# Altium footprint library Mine.PcbLib: 306 footprints (part 10 of 20)
Each footprint in its own frame and in the unit in brackets; x right, y up, seen from the top. Pads: shape width x height; smd on the part's side, far side on the other; paste and mask are expansions set on the pad; w line width, h text height; cw(c..) or ccw(c..) is an arc to the next point about the centre after c.
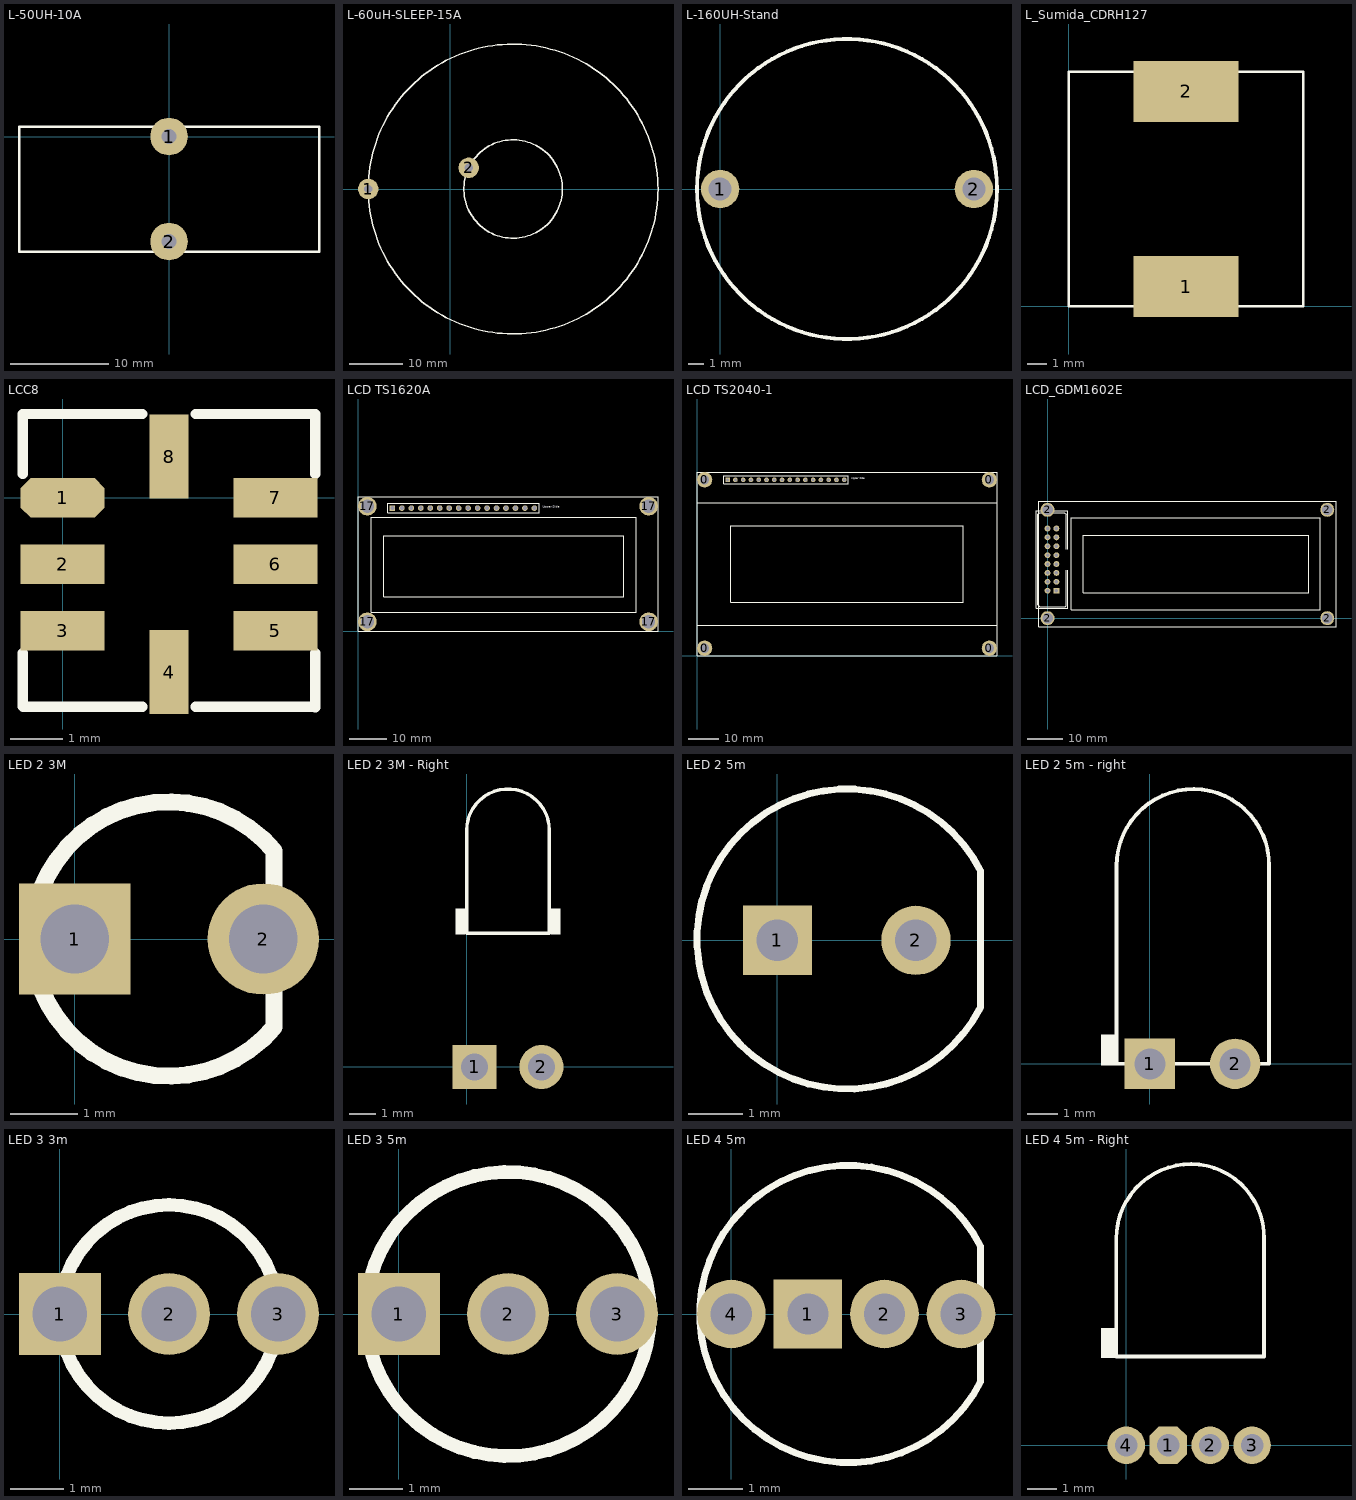
[diagram p9: the footprints below, top view; thin cyan lines are the x and y axes]

## L-50UH-10A [mil]
pads (2):
  round 150 hole 60: 1(0,0) 2(0,-420)
Top Overlay:
  lines w10: -600,-460 -600,40 600,40 600,-460 -600,-460

## L-60uH-SLEEP-15A [mil]
pads (2):
  round 150 hole 60: 1(-600,0) 2(135,155)
Top Overlay:
  circle w10: c460,0 r1060
  circle w10: c460,0 r360

## L-160UH-Stand [mil]
pads (2):
  round 100 hole 60: 1(0,0) 2(660,0)
Top Overlay:
  circle w10: c330,0 r390

## L_Sumida_CDRH127 [mm]
height 8
pads (2):
  rect 5.5x3.2 smd: 1(6.15,1.038) 2(6.15,11.262)
Top Overlay:
  lines w0.127: 0,0 12.3,0 12.3,12.3 0,12.3 0,0

## LCC8 [mm]
height 2
pads (8):
  oct 1.6x0.75 smd: 1(0,0)
  rect 1.6x0.75 smd: 2(0,-1.27) 3(0,-2.54) 5(4.064,-2.54) 6(4.064,-1.27) 7(4.064,0)
  rect 0.75x1.6 smd: 4(2.032,-3.327) 8(2.032,0.787)
Top Overlay:
  lines w0.2: -0.762,-2.972 -0.762,-3.976 -0.75,-3.988 1.524,-3.988 ; -0.762,0.457 -0.762,1.6 1.524,1.6 ; 2.54,-3.988 4.814,-3.988 4.826,-4 4.826,-2.972 ; 2.54,1.6 4.826,1.6 4.826,0.457

## LCD TS1620A [mil] "LCD 2x16"
height 551.18
pads (20):
  rect 60x60 hole 40: 1(363.41,1299.21)
  round 60 hole 40: 2(463.41,1299.21) 3(563.41,1299.21) 4(663.41,1299.21) 5(763.41,1299.21) 6(863.41,1299.21) 7(963.41,1299.21) 8(1063.41,1299.21) 9(1163.41,1299.21) 10(1263.41,1299.21) 11(1363.41,1299.21) 12(1463.41,1299.21) 13(1563.41,1299.21) 14(1663.41,1299.21) 15(1763.41,1299.21) 16(1863.41,1299.21)
  round 196.85 hole 137.8: 17(98.41,98.43) 17(98.41,1318.9) 17(3070.85,98.43) 17(3070.85,1318.9)
Top Overlay:
  lines w5: 0,0 3169.29,0 3169.29,1417.32 0,1417.32 0,0 ; 137.8,196.85 2940.95,196.85 2940.95,1200.79 137.8,1200.79 137.8,196.85 ; 269.69,360.24 2809.06,360.24 2809.06,1005.91 269.69,1005.91 269.69,360.24 ; 313.41,1249.21 1913.41,1249.21 1913.41,1349.21 313.41,1349.21 313.41,1249.21
  text "Upper Side" at 1953.41,1292.64 h40

## LCD TS2040-1 [mm] "LCD 4x20"
height 14
pads (20):
  round 5 hole 3: 0(2.5,2.5) 0(2.5,57.5) 0(95.5,2.5) 0(95.5,57.5)
  rect 1.524x1.524 hole 1.016: 1(10,57.5)
  round 1.524 hole 1.016: 2(12.54,57.5) 3(15.08,57.5) 4(17.62,57.5) 5(20.16,57.5) 6(22.7,57.5) 7(25.24,57.5) 8(27.78,57.5) 9(30.32,57.5) 10(32.86,57.5) 11(35.4,57.5) 12(37.94,57.5) 13(40.48,57.5) 14(43.02,57.5) 15(45.56,57.5) 16(48.1,57.5)
Top Overlay:
  lines w0.127: 0,10 98,10 ; 0,50 98,50 ; 0,0 0,60 98,60 98,0 0,0 ; 8.73,56.23 8.73,58.77 49.37,58.77 49.37,56.23 8.73,56.23 ; 11,17.5 87,17.5 87,42.5 11,42.5 11,17.5
  text "Upper Side" at 50.386,57.333 h1.02

## LCD_GDM1602E [mil] "LCD 2x16 with seperate backlight"
height 531.5
pads (20):
  rect 65x65 hole 40: 1(100.05,309.43)
  round 157.48 hole 118.11: 2(0,-0.47) 2(0,1220) 2(3149.61,-0.47) 2(3149.61,1220)
  round 65 hole 40: 2(0.05,309.43) 3(100.05,409.43) 4(0.05,409.43) 5(100.05,509.43) 6(0.05,509.43) 7(100.05,609.43) 8(0.05,609.43) 9(100.05,709.43) 10(0.05,709.43) 11(100.05,809.43) 12(0.05,809.43) 13(100.05,909.43) 14(0.05,909.43) 15(100.05,1009.43) 16(0.05,1009.43)
Top Overlay:
  lines w5: -98.41,-98.9 -98.41,1318.43 3248.05,1318.43 3248.05,-98.9 -98.41,-98.9 ; 268.19,93.03 268.19,1128.46 3071.34,1128.46 3071.34,93.03 268.19,93.03 ; 400.08,287.91 400.08,933.58 2939.45,933.58 2939.45,287.91 400.08,287.91
  lines w10: 210.05,539.43 210.05,139.43 200.05,129.43 -89.95,129.43 -109.95,149.43 -109.95,1169.43 -89.95,1189.43 190.05,1189.43 210.05,1169.43 210.05,774.43 ; 230.05,539.43 230.05,109.43 100.05,109.43 -129.95,109.43 -129.95,1209.43 230.05,1209.43 230.05,774.43

## LED 2 3M [mil]
pads (2):
  rect 65x65 hole 40: 1(0,0)
  round 65 hole 40: 2(110,0)
Top Overlay:
  lines w10: 116.28,-51.42 cw(c55,0) 116.28,51.42 116.28,-51.42

## LED 2 3M - Right [mil]
pads (2):
  rect 65x65 hole 40: 1(11.81,0)
  round 65 hole 40: 2(110.24,0)
Top Overlay:
  rectangle: 124.55,194.85 138.33,233.72
  region: -2.5,233.72 -16.28,233.72 -16.28,194.85 -2.5,194.85
  lines w5: 0,196.85 122.05,196.85 122.05,348.43 ccw(c61.02,348.43) 0,348.43 0,196.85

## LED 2 5m [mil]
pads (2):
  rect 50x50 hole 30: 1(0,0)
  round 50 hole 30: 2(100,0)
Top Overlay:
  lines w5: 146.59,-48.37 cw(c50.24,1) 146.66,50.24 ; 146.59,-48.21 146.59,50.21
3D body: height 346.96, standoff -235.72, extent -66.69,-116.99 146.69,120

## LED 2 5m - right [mil]
pads (2):
  rect 65x65 hole 40: 1(0,0)
  round 65 hole 40: 2(110,0)
Top Overlay:
  rectangle: -63,-2 -43,38
  lines w5: -43,0 153.85,0 153.85,255 ccw(c55.76,256.24) 57,354.33 ccw(c56.67,254.67) -43,255 -43,0

## LED 3 3m [mil]
pads (3):
  rect 60x60 hole 40: 1(0,0)
  round 60 hole 40: 2(80,0) 3(160,0)
Top Overlay:
  circle w10: c80,0 r80

## LED 3 5m [mil]
pads (3):
  rect 60x60 hole 40: 1(0,0)
  round 60 hole 40: 2(80,0) 3(160,0)
Top Overlay:
  circle w10: c80,0 r104.17

## LED 4 5m [mil]
pads (4):
  rect 50x50 hole 30: 1(55.77,0)
  round 50 hole 30: 2(111.55,0) 3(167.32,0) 4(0,0)
Top Overlay:
  lines w5: 181.59,-49.37 cw(c85.24,0) 181.66,49.25 ; 181.59,-49.21 181.59,49.21
3D body: height 346.96, standoff -235.72, extent -31.63,-117.96 181.76,119.03

## LED 4 5m - Right [mil]
height 196.85
pads (4):
  oct 50x50 hole 30: 1(55.77,0)
  round 50 hole 30: 2(111.55,0) 3(167.32,0) 4(0,0)
Top Overlay:
  rectangle: -33.47,116.11 -13.47,156.11
  lines w5: 86.54,374.32 cw(c85.3,276.24) 183.38,275 183.38,118.11 -13.47,118.11 -13.47,275 cw(c86.19,274.67) 86.53,374.33